# Altium footprint library Conectores.PcbLib: 68 footprints (part 5 of 5)
Each footprint in its own frame and in the unit in brackets; x right, y up, seen from the top. Pads: shape width x height; smd on the part's side, far side on the other; paste and mask are expansions set on the pad; w line width, h text height; cw(c..) or ccw(c..) is an arc to the next point about the centre after c.
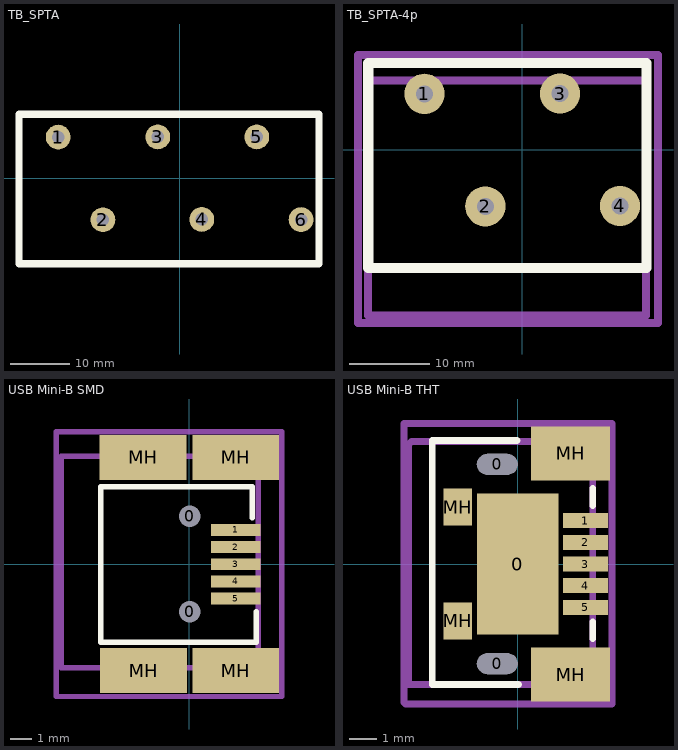
[diagram p4: the footprints below, top view; thin cyan lines are the x and y axes]

## TB_SPTA [mm] "PCB terminal block, Nominal current: 41 A, Nom. voltage: 1000 V, Pitch: 7.5 mm, Number of positions: 2,  Connection method: Push-in connection, Mounting: Soldering, Conductor/PCB connection direction: 30 °"
pads (6):
  round 4.2 hole 2.1: 1(-20.561,6.985) 2(-12.992,-7.01) 3(-3.696,7.01) 4(3.746,-6.96) 5(13.068,7.01) 6(20.561,-6.985)
Top Overlay:
  lines w1.254: -27.203,-14.427 -27.203,10.82 23.597,10.82 23.597,-14.427 -27.203,-14.427
3D body: height 34.58, standoff -3.91, extent -27.09,-20.359 23.311,8.641

## TB_SPTA-4p [mm] "PCB terminal block, Nominal current: 41 A, Nom. voltage: 1000 V, Pitch: 7.5 mm, Number of positions: 4,  Connection method: Push-in connection, Mounting: Soldering, Conductor/PCB connection direction: 30 °"
pads (4):
  round 5 hole 2.1: 1(-12.154,6.985) 2(-4.585,-7.01) 3(4.712,7.01) 4(12.154,-6.96)
Top Overlay:
  lines w1.254: -19.152,-14.681 15.469,-14.681 15.469,10.82 -19.152,10.82 -19.152,-14.681
Mechanical 13:
  lines w1: -19.202,-20.574 -19.202,8.661 15.392,8.661 15.392,-20.574 -19.202,-20.574
Mechanical 15:
  lines w1: -20.422,-21.514 -20.422,11.811 16.891,11.811 16.891,-21.514 -20.422,-21.514
3D body: height 33.98, standoff -4.51, extent -18.69,-20.317 14.91,8.683

## USB Mini-B SMD [mm] "USB Series Mini-B Receptacle"
pads (11):
  round 0.95 hole 1: 0(0.013,-2.225) 0(0.013,2.225)
  rect 2.3x0.55 smd: 1(2.163,1.59) 2(2.163,0.79) 3(2.163,-0.01) 4(2.163,-0.81) 5(2.163,-1.61)
  rect 4.05x2.1 smd: MH(-2.163,4.975) MH(-2.137,-4.975) MH(2.163,-4.975) MH(2.163,4.975)
Top Overlay:
  lines w0.254: 2.934,2.149 2.934,3.597 -4.127,3.597 -4.127,-3.642 3.112,-3.642 3.112,-2.22
Mechanical 13:
  lines w0.254: -5.982,-4.836 3.213,-4.836 3.213,5.019 -5.982,5.019 -5.982,-4.836
Mechanical 15:
  lines w0.254: -6.21,-6.182 -6.21,6.162 4.305,6.162 4.305,-6.182 -6.21,-6.182
3D body: height 3.9, standoff -1.05, extent -5.965,-4.935 3.035,4.965

## USB Mini-B THT [mm] "USB Series Mini-B Receptacle"
pads (12):
  oval 1.45x0.75 hole 0.762 slot 1.5 at 0 deg: 0(-0.75,-3.675) 0(-0.75,3.675)
  rect 3x5.2 smd: 0(0,0)
  rect 1.65x0.55 smd: 1(2.5,1.6) 2(2.5,0.8) 3(2.5,0) 4(2.5,-0.8) 5(2.5,-1.6)
  rect 1.05x1.35 smd: MH(-2.2,-2.1) MH(-2.2,2.1)
  rect 2.91x2 smd: MH(1.95,-4.075) MH(1.95,4.075)
Top Overlay:
  lines w0.254: -0.025,4.547 -3.15,4.547 -3.15,-4.445 0.025,-4.445 ; 2.769,-2.743 2.769,-2.134 ; 2.769,2.159 2.769,2.794
Mechanical 13:
  lines w0.254: -4.013,-4.445 -4.013,4.42 -3.912,4.521 2.769,4.521 2.769,-4.445 -4.013,-4.445
Mechanical 15:
  lines w0.254: -4.191,-5.105 -4.191,5.182 3.48,5.182 3.48,-5.156 -4.14,-5.156
3D body: height 4.05, standoff -0.6, extent -3.881,-4.575 2.819,4.525